# Altium footprint library LUMI_Handy_Soldering_LIB.PcbLib: 562 footprints (part 28 of 36)
Each footprint in its own frame and in the unit in brackets; x right, y up, seen from the top. Pads: shape width x height; smd on the part's side, far side on the other; paste and mask are expansions set on the pad; w line width, h text height; cw(c..) or ccw(c..) is an arc to the next point about the centre after c.
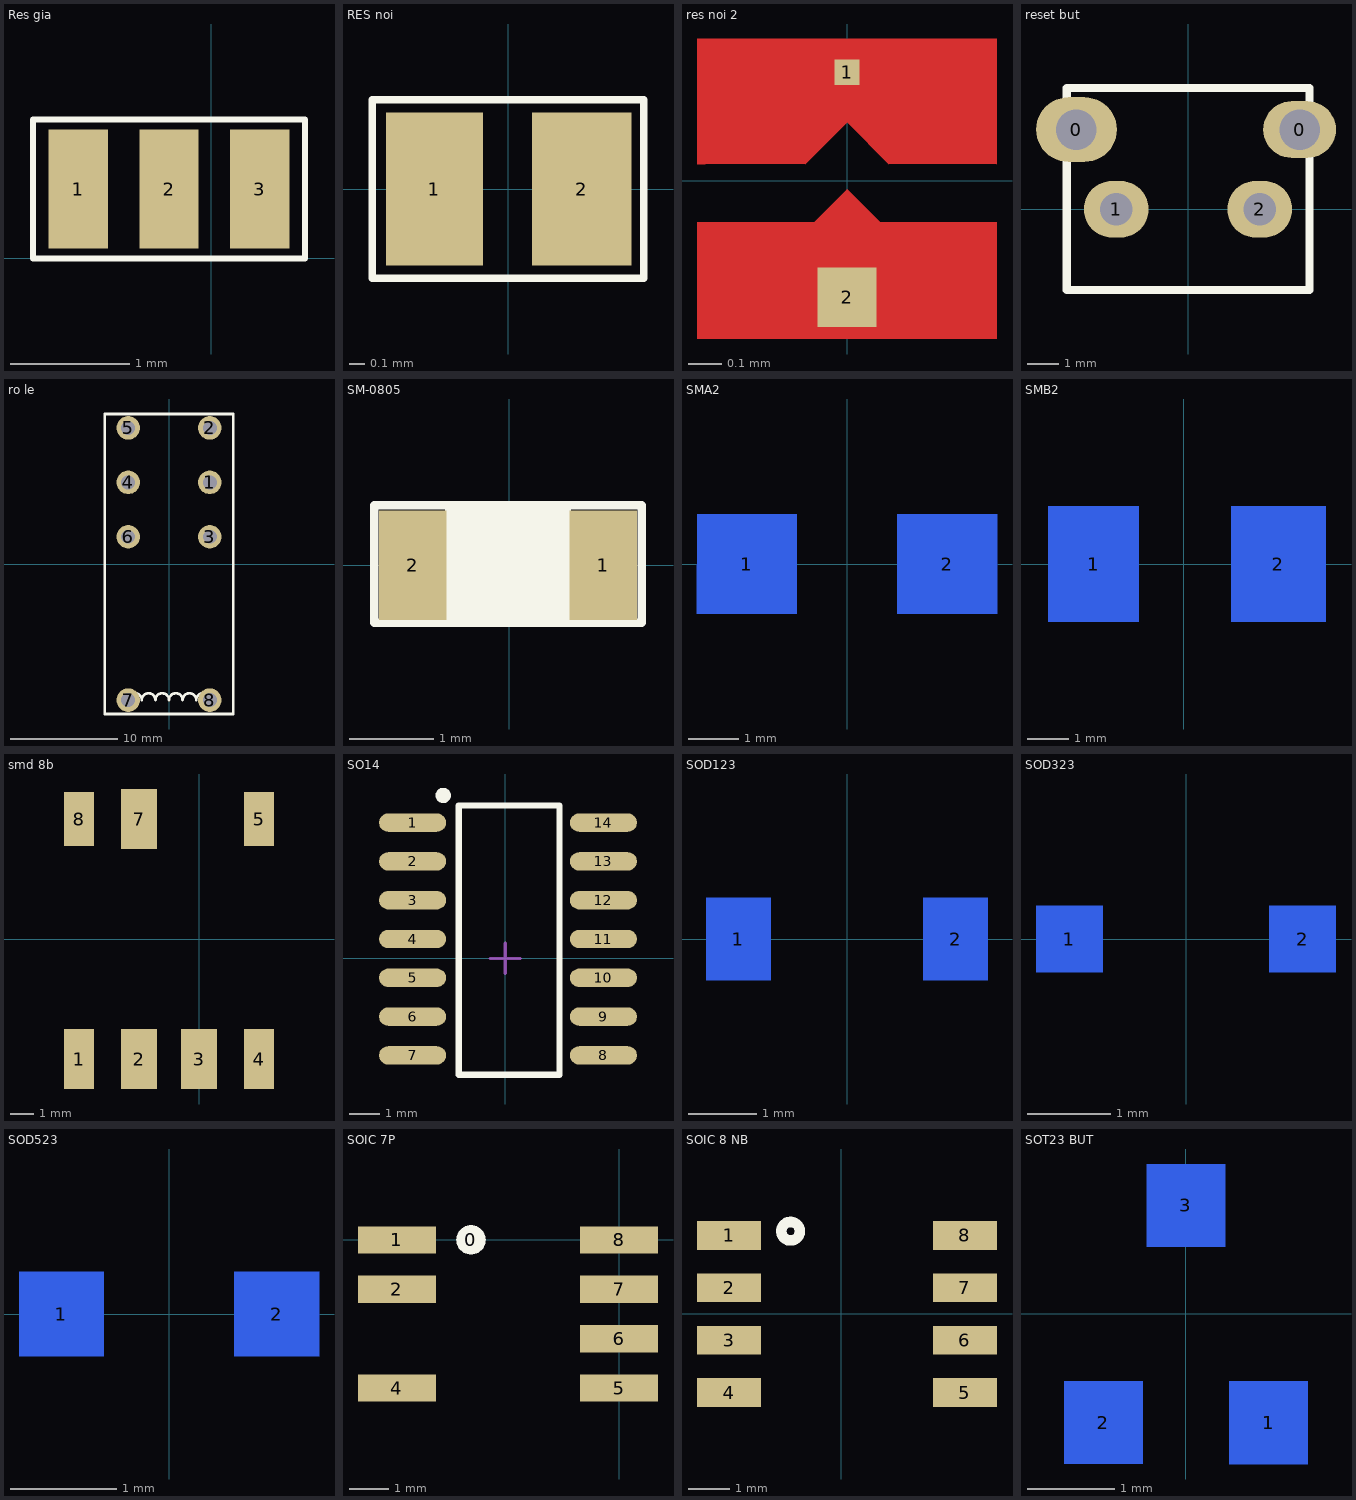
[diagram p27: the footprints below, top view; thin cyan lines are the x and y axes]

## Res gia [mm] "Res gia 3 chan"
pads (3):
  rect 0.5x1 smd: 1(-1.118,0.584) 2(-0.356,0.584) 3(0.406,0.584)
Top Overlay:
  lines w0.05: -1.499,0 0.787,0 0.787,1.168 -1.499,1.168 -1.499,0

## RES noi [mm]
pads (2):
  rect 0.635x1 smd: 1(-0.483,0)
  rect 0.652x1 smd: 2(0.483,0)
Top Overlay:
  lines w0.05: -0.889,-0.584 0.889,-0.584 0.889,0.584 -0.889,0.584 -0.889,-0.584

## res noi 2 [mil]
pads (2):
  rect 3x3 smd: 1(0,12.8)
  rect 7x7 smd: 2(0,-13.78)
Top Layer:
  region: -10.83,1.97 -4.92,1.97 0,6.89 4.92,1.97 10.83,1.97 0,12.8
  region: 3.94,16.73 -17.72,16.73 -17.72,1.97 -16.73,1.97 -13.78,1.97 -10.83,1.97
  region: 17.72,16.73 17.72,1.97 13.78,1.97 10.83,1.97 -3.94,16.73
  region: 17.72,-4.92 17.72,-18.7 2.95,-18.7 3.94,-4.92
  region: 6.89,-7.87 -2.95,-6.89 -2.95,-4.92 -17.72,-4.92 -17.72,-18.7 2.95,-18.7 4.92,-14.76
  region: -13.78,-14.76 -4.92,-14.76 0,-9.84 4.92,-14.76 13.78,-14.76 0,-0.98
Top Solder:
  rectangle: -17.72,-18.7 17.72,16.73

## reset but [mil]
pads (4):
  oval 100x80 hole 50: 0(-137.8,98.43)
  oval 90x70 hole 50: 0(137.8,98.43)
  oval 80x70 hole 40: 1(-88.58,0) 2(88.58,0)
Top Overlay:
  lines w10: -149.84,-100 150.16,-100 150.16,150 -149.84,150 -149.84,-100
Bottom Overlay:
  lines w3: 0,-98.43 0,147.64
3D body: height 291.34, standoff -137.8, extent -171.26,-124.01 171.27,157.49

## ro le [mm]
pads (8):
  round 2.2 hole 1.3: 1(3.81,7.62) 2(3.81,12.7) 3(3.81,2.54) 4(-3.81,7.62) 5(-3.81,12.7) 6(-3.81,2.54) 7(-3.81,-12.7) 8(3.81,-12.7)
Top Overlay:
  lines w0.254: -3.81,-12.7 cw(c-3.175,-12.7) -2.54,-12.7 cw(c-1.905,-12.7) -1.27,-12.7 cw(c-0.635,-12.7) 0,-12.7 cw(c0.635,-12.7) 1.27,-12.7 cw(c1.905,-12.7) 2.54,-12.7 cw(c3.175,-12.7) 3.81,-12.7 ; -6,-14 -6,14 6,14 6,-14 -6,-14
3D body: height 25.53, standoff -4.44, extent -6.388,-14.707 6.337,14.249

## SM-0805 [mm]
pads (2):
  rect 0.8x1.3 smd: 1(1.118,0) 2(-1.143,0)
Top Overlay:
  rectangle: -0.711,-0.686 0.686,0.711
  lines w0.1: -0.711,-0.686 -0.711,0.711 ; 0.686,-0.686 0.686,0.711
  lines w0.102: -1.6,-0.686 1.575,-0.686 1.575,0.711 -1.6,0.711 -1.6,-0.686
3D body: height 0.5, standoff 0, extent -1,-0.625 1,0.625

## SMA2 [mm]
pads (2):
  rect 2x2 smd far side: 1(-2.016,0) 2(2,0)
Bottom Overlay:
  lines w0.05: -1,-1 -1,1 ; 1,-1 1,1 ; -3,-1 -3,1 3,1 3,-1 -3,-1
3D body: height 1.87, standoff -0.33, extent -2.5,-1.35 2.5,1.35

## SMB2 [mm]
pads (2):
  rect 2.2x2.8 smd far side: 1(-2.2,0)
  rect 2.3x2.8 smd far side: 2(2.3,0)
Bottom Overlay:
  lines w0.05: -1.1,-1.4 -1.1,1.4 ; 1.1,-1.4 1.1,1.4 ; -3.3,-1.4 3.5,-1.4 3.5,1.4 -3.3,1.4 -3.3,-1.4
3D body: height -0.4, standoff -2.7, extent -2.6,-1.8 2.8,1.8

## smd 8b [mil]
pads (7):
  rect 50x100 smd: 1(-200,-200) 4(100,-200)
  rect 60x100 smd: 2(-100,-200) 3(0,-200) 7(-100,200)
  rect 50x90 smd: 5(100,200) 8(-200,200)
3D body: height 200, standoff 0, extent -240.16,-202.76 150,202.76

## SO14 [mm] "SOIC, 16-Leads, Body 9.9x3.9mm, Pitch 1.27mm, IPC Medium Density"
height 1.75
pads (14):
  oval 2.2x0.6 smd: 1(-3.035,4.445) 2(-3.035,3.175) 3(-3.035,1.905) 4(-3.035,0.635) 5(-3.035,-0.635) 6(-3.035,-1.905) 7(-3.035,-3.175) 8(3.214,-3.175) 9(3.214,-1.905) 10(3.214,-0.635) 11(3.214,0.635) 12(3.214,1.905) 13(3.214,3.175) 14(3.214,4.445)
Top Overlay:
  circle w0.25: c-2.03,5.334 r0.125
  lines w0.2: -1.524,-3.81 -1.524,5 1.778,5 1.778,-3.81 -1.524,-3.81
Mechanical 15:
  lines w0.1: -0.5,0 0.5,0 ; 0,-0.5 0,0.5
3D body: height 1.56, standoff -0.03, extent -3.123,-3.666 3.123,4.936

## SOD123 [mm]
pads (2):
  rect 0.95x1.22 smd far side: 1(-1.6,0) 2(1.6,0)
Bottom Overlay:
  rectangle: 0.4,-0.6 0.9,0.6
  lines w0.05: -1.1,-0.6 -1.099,0.6 ; 1.1,-0.6 1.101,0.6 ; -2.1,-0.6 -2.1,0.6 2.1,0.6 2.1,-0.6 -2.1,-0.6
3D body: height -0.46, standoff -1.73, extent -1.85,-0.8 1.85,0.8

## SOD323 [mm]
pads (2):
  rect 0.8x0.8 smd far side: 1(-1.4,0) 2(1.4,0)
Bottom Overlay:
  lines w0.05: -0.972,-0.4 -0.972,0.4 ; 0.974,-0.4 0.974,0.4 ; -1.778,-0.4 -1.778,0.398 1.778,0.398 1.778,-0.4 -1.778,-0.4
  lines w0.254: 0.635,-0.254 0.635,0.254
3D body: height -0.41, standoff -1.51, extent -1.3,-0.675 1.3,0.675

## SOD523 [mm]
pads (2):
  rect 0.8x0.8 smd far side: 1(-1.016,0) 2(1.016,0)
Bottom Overlay:
  lines w0.05: -1.4,-0.4 1.4,-0.4 ; -1.4,0.398 1.4,0.398 ; -1.399,-0.4 -1.399,0.4 ; -0.599,-0.4 -0.599,0.4 ; 0.601,-0.4 0.601,0.4 ; 1.401,-0.4 1.401,0.4
3D body: height -0.41, standoff -1.11, extent -0.8,-0.399 0.8,0.399

## SOIC 7P [mm]
pads (8):
  round 0.762 on Top Overlay: 0(-3.81,0)
  rect 2x0.7 smd: 1(-5.715,0) 2(-5.715,-1.27) 4(-5.715,-3.81) 5(0,-3.81) 6(0,-2.54) 7(0,-1.27) 8(0,0)
3D body: height -0.5, standoff -2.25, extent -5.825,-4.405 0.186,0.595

## SOIC 8 NB [mm]
pads (8):
  rect 1.55x0.7 smd: 1(-2.715,1.9) 2(-2.715,0.63) 3(-2.715,-0.64) 4(-2.715,-1.91) 5(3,-1.91) 6(3,-0.64) 7(3,0.63) 8(3,1.9)
Top Overlay:
  circle w0.254: c-1.224,2 r0.224
3D body: height -0.5, standoff -2.25, extent -2.825,-2.505 3.186,2.495

## SOT23 BUT [mm]
pads (3):
  rect 0.9x0.95 smd far side: 1(0.95,-1.25) 2(-0.95,-1.25) 3(0,1.25)
Bottom Overlay:
  circle w0.25: c0.891,-0.508 r0.125
  lines w0.2: -1.3,-0.375 -1.3,1.25 -0.85,1.25 ; 0.85,1.25 1.3,1.25 1.3,-0.375
3D body: height -0.38, standoff -1.38, extent -1.461,-1.171 1.459,1.169